# Altium footprint library North POLE.PcbLib: 419 footprints (part 24 of 27)
Each footprint in its own frame and in the unit in brackets; x right, y up, seen from the top. Pads: shape width x height; smd on the part's side, far side on the other; paste and mask are expansions set on the pad; w line width, h text height; cw(c..) or ccw(c..) is an arc to the next point about the centre after c.
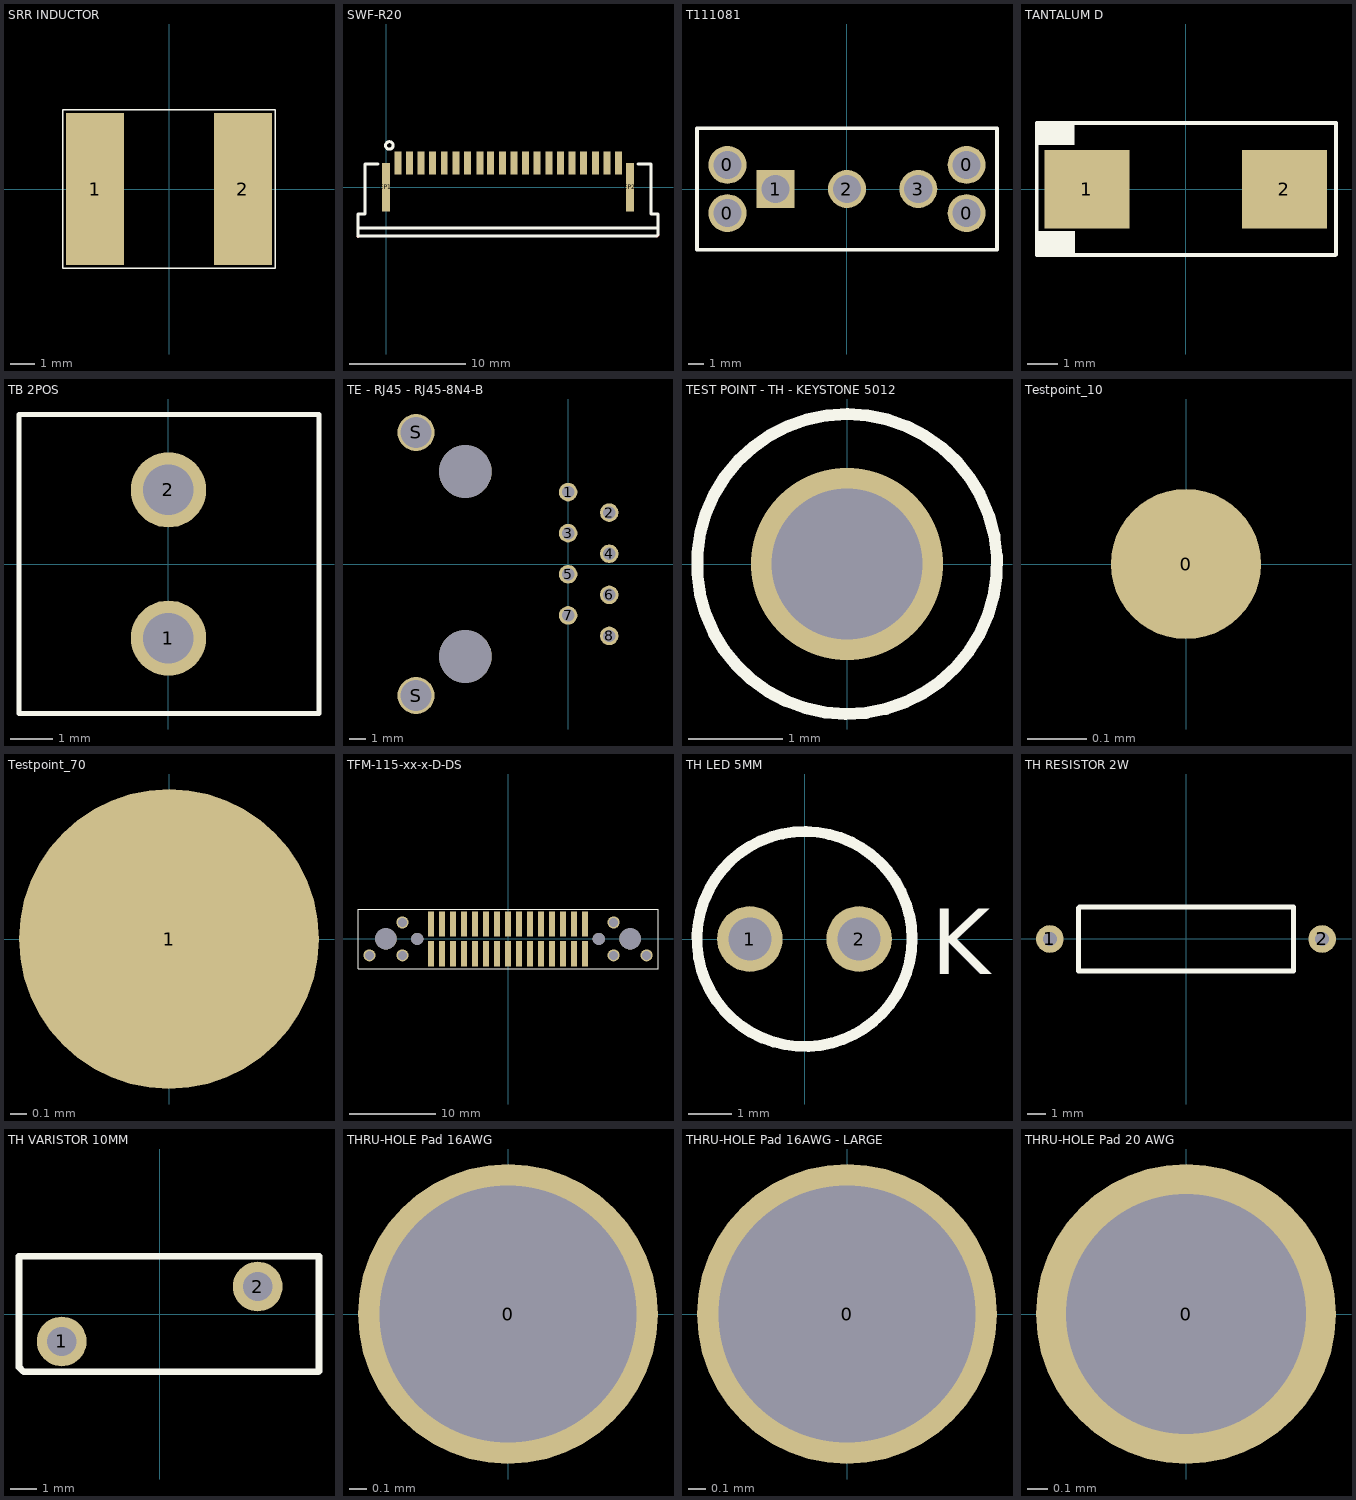
[diagram p23: the footprints below, top view; thin cyan lines are the x and y axes]

## SRR INDUCTOR [mm]
pads (2):
  rect 2.4x6.3 smd mask+0.08: 1(-3.05,0) 2(3.05,0)
Top Overlay:
  lines w0.076: -4.394,-3.277 4.394,-3.277 4.394,3.277 -4.394,3.277 -4.394,-3.277
3D body: height 2.8, standoff 0, extent -2.946,-2.921 2.921,2.921

## SWF-R20 [mm]
pads (22):
  rect 0.6x2 smd: 1(1,2.1) 2(2,2.1) 3(3,2.1) 4(4,2.1) 5(5,2.1) 6(6,2.1) 7(7,2.1) 8(8.075,2.1) 9(9,2.1) 10(10,2.1) 11(11,2.1) 12(12,2.1) 13(13,2.1) 14(14,2.1) 15(15,2.1) 16(16,2.1) 17(17,2.1) 18(18,2.1) 19(19,2.1) 20(20,2.1)
  rect 0.7x4.2 smd: EP1(0,0) EP2(21,0)
Top Layer:
  lines w0.254: -2.425,-4.225 -2.4,-4.2 ; 23.325,-4.2 23.4,-4.125
Top Overlay:
  circle w0.254: c0.275,3.6 r0.326
  lines w0.254: -2.425,-4.225 -2.425,-3.5 ; -2.4,-4.2 23.325,-4.2 ; -0.7,2 -1.825,2 -1.825,-2.3 -2.425,-2.3 -2.425,-3.5 ; 21.675,2 22.8,2 22.8,-2.3 23.4,-2.3 23.4,-3.5 -2.425,-3.5 ; 23.4,-4.125 23.4,-3.1

## T111081 [mm] "E-Switch"
height 25
pads (7):
  round 2.5 hole 1.85: 0(-7.869,-1.59) 0(-7.869,1.59) 0(7.879,-1.59) 0(7.879,1.59) 2(0,0) 3(4.696,0)
  rect 2.5x2.5 hole 1.85: 1(-4.702,0)
Top Overlay:
  lines w0.254: -9.873,-4 -9.87,-4.003 9.881,-4.003 9.881,4 9.878,4.003 -9.873,4.003 -9.873,-4

## TANTALUM D [mm]
pads (2):
  rect 2.77x2.55 smd mask+0.08: 1(-3.22,0) 2(3.22,0)
Top Overlay:
  region: -4.877,2.15 -4.877,1.448 -3.632,1.448 -3.632,2.159
  region: -4.857,-1.38 -4.857,-2.083 -3.613,-2.083 -3.613,-1.372
  lines w0.127: 4.877,-2.15 -4.851,-2.15 -4.851,2.15 4.902,2.15 4.902,-2.125
3D body: height 2.8, standoff 0, extent -3.65,-2.15 3.65,2.15

## TB 2POS [mil]
pads (2):
  round 70 hole 47: 1(0,-68.9) 2(0,68.9)
Top Overlay:
  lines w5: -139,-139 140,-139 140,139 -139,139 -139,-139
3D body: height 385.43, standoff -146.06, extent -168.84,-222.61 154,201.01

## TE - RJ45 - RJ45-8N4-B [mil]
pads (12):
  round 45 hole 30: 1(0,175) 2(100,125) 3(0,75) 4(100,25) 5(0,-25) 6(100,-75) 7(0,-125) 8(100,-175)
  round 90 hole 76: S(-370,-320) S(-370,320)
  round 128 hole 128 unplated: ""(-250,-225) ""(-250,225)
3D body: height 503, standoff -155, extent -552,-352.7 174,347.3

## TEST POINT - TH - KEYSTONE 5012 [mm]
via 0,0 diameter 2.032 hole 1.6
Top Overlay:
  lines w0.127: 1.409,0.732 ccw(c0,0) 1.42,0.71

## Testpoint_10 [mil] "10 mil testpoint"
pads (1):
  round 10 smd: 0(0,0)

## Testpoint_70 [mil] "10 mil testpoint"
pads (1):
  round 70 smd: 1(0,0)

## TFM-115-xx-x-D-DS [mm]
pads (40):
  rect 0.74x2.92 smd: 1(-8.89,-1.715) 2(-8.89,1.715) 3(-7.62,-1.715) 4(-7.62,1.715) 5(-6.35,-1.715) 6(-6.35,1.715) 7(-5.08,-1.715) 8(-5.08,1.715) 9(-3.81,-1.715) 10(-3.81,1.715) 11(-2.54,-1.715) 12(-2.54,1.715) 13(-1.27,-1.715) 14(-1.27,1.715) 15(0,-1.715) 16(0,1.715) 17(1.27,-1.715) 18(1.27,1.715) 19(2.54,-1.715) 20(2.54,1.715) 21(3.81,-1.715) 22(3.81,1.715) 23(5.08,-1.715) 24(5.08,1.715) 25(6.35,-1.715) 26(6.35,1.715) 27(7.62,-1.715) 28(7.62,1.715) 29(8.89,-1.715) 30(8.89,1.715)
  round 1.4 hole 1.016 unplated mask+0.1: ""(-16.002,-1.905) ""(-12.192,-1.905) ""(-12.192,1.905) ""(12.192,-1.905) ""(12.192,1.905) ""(16.002,-1.905)
  oval 2.489x2.413 hole 2.489 unplated mask+0.1: ""(-14.097,0) ""(14.097,0)
  round 1.4 hole 1.4 unplated mask+0.1: ""(-10.477,0) ""(10.477,0)
Top Overlay:
  lines w0.127: -17.323,-3.454 -17.323,3.429 17.323,3.429 17.323,-3.454 -17.323,-3.454
3D body: height 5.59, standoff -2.01, extent -17.145,-2.985 17.145,2.984

## TH LED 5MM [mil]
pads (2):
  round 60 hole 39.37: 1(-50,0) 2(50,0)
Top Overlay:
  lines w10: 88.18,43.72 ccw(c0,0) 88.88,42.27
  text "K" at 116.14,-32.48 h60
3D body: height 1025.59, standoff -391.73, extent -105.31,-115.16 106.9,113.18

## TH RESISTOR 2W [mil]
pads (2):
  round 60 hole 30: 1(-295,0) 2(295,0)
Top Overlay:
  lines w10: -233,-69.4 -233,67.4 -231,69.4 233,69.4 233,-69.4 -233,-69.4
3D body: height 169.39, standoff -96.85, extent -307.08,-69.39 307.1,69.4

## TH VARISTOR 10MM [mm]
pads (2):
  round 1.905 hole 1.118: 1(-3.75,-1.05) 2(3.75,1.05)
Top Overlay:
  lines w0.254: 6.096,2.184 6.096,-2.184 6.071,-2.21 -5.207,-2.21 -5.385,-2.032 -5.385,2.21 6.096,2.21
3D body: height 15.96, standoff -2.54, extent -5.547,-1.945 5.887,1.836

## THRU-HOLE Pad 16AWG [mm]
pads (1):
  round 1.75 hole 1.5 mask+0.5: 0(0,0)

## THRU-HOLE Pad 16AWG - LARGE [mm]
pads (1):
  round 1.75 hole 1.5 mask+0.5: 0(0,0)

## THRU-HOLE Pad 20 AWG [mm]
pads (1):
  round 1.5 hole 1.2 mask+0.5: 0(0,0)